# Altium integrated library chipfc_altium_libs.IntLib: 266 symbols (part 2 of 3)
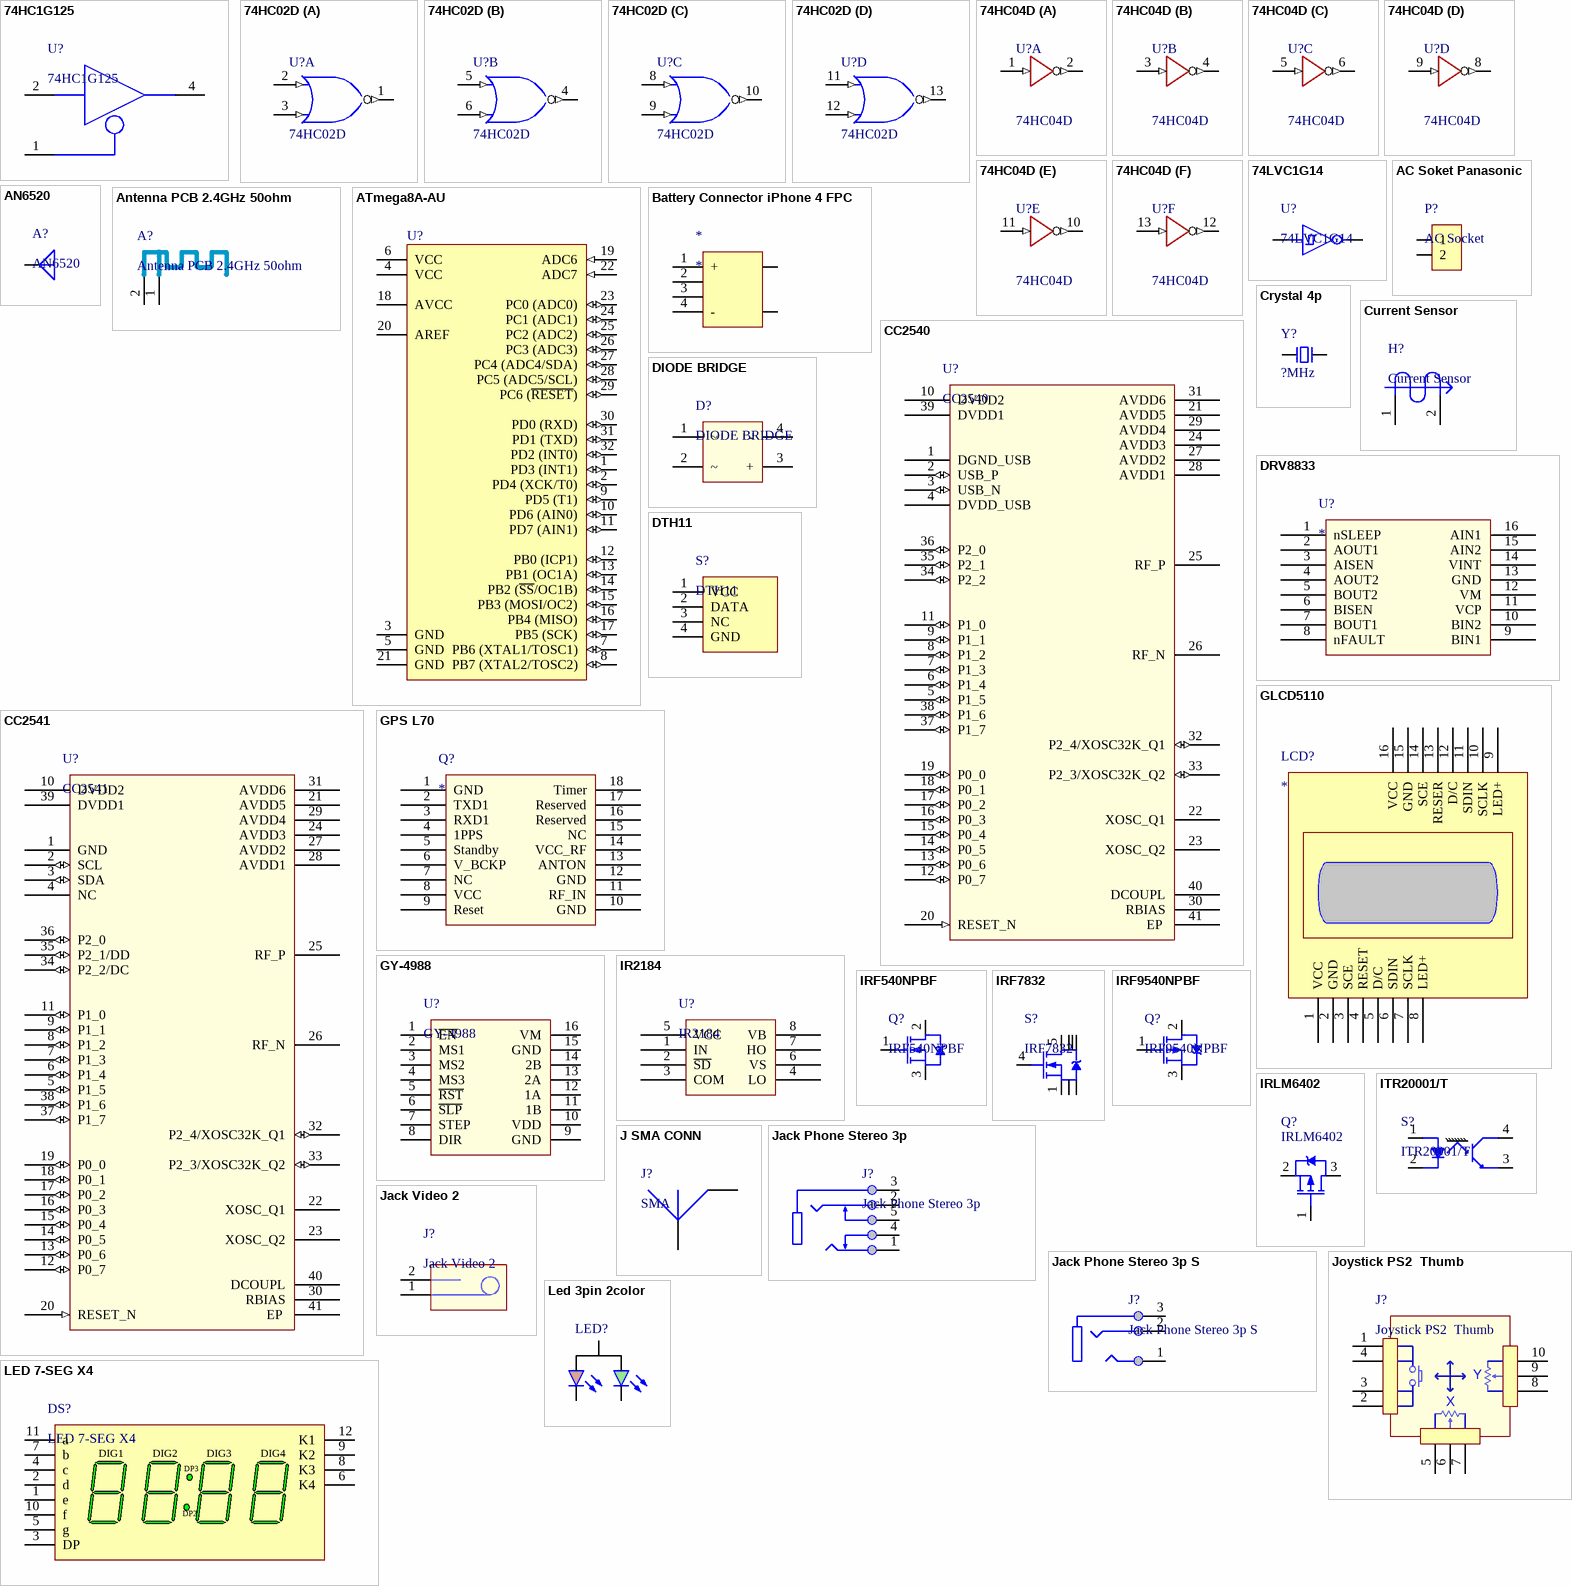
[diagram p16: symbols 74HC1G125 to LED 7-SEG X4]

## CC2540
designator U?
IC SOC BLUETOOTH SMART 40VQFN; PART NO: CC2540F128RHAR; BRAND: TI; PACKAGE: 40-VFQFN; TYPE: SMD
footprint QFN P50 40 CC254x (L)
footprint QFN P50 40 CC254x (N)
pins: 1 DGND_USB "Connect to GND", 2 USB_P (io) "USB P", 3 USB_N (io) "USB N", 4 DVDD_USB "2-V–3.6-V digital power-supply connection", 5 P1_5 (io) "Port 1.5", 6 P1_4 (io) "Port 1.4", 7 P1_3 (io) "Port 1.3", 8 P1_2 (io) "Port 1.2", 9 P1_1 (io) "Port 1.1 – 20-mA drive capability", 10 DVDD2 "2-V–3.6-V digital power-supply connection", 11 P1_0 (io) "Port 1.0 – 20-mA drive capability", 12 P0_7 (io) "Port 0.7", 13 P0_6 (io) "Port 0.6", 14 P0_5 (io) "Port 0.5", 15 P0_4 (io) "Port 0.4", 16 P0_3 (io) "Port 0.3", 17 P0_2 (io) "Port 0.2", 18 P0_1 (io) "Port 0.1", 19 P0_0 (io) "Port 0.0", 20 RESET_N (in) "Digital input", 21 AVDD5 "2-V–3.6-V analog power-supply connection", 22 XOSC_Q1 "32-MHz crystal oscillator pin 1 or external-clock input", 23 XOSC_Q2 "32-MHz crystal oscillator pin 2", 24 AVDD3 "2-V–3.6-V analog power-supply connection", 25 RF_P "Positive RF input signal to LNA during RX", 26 RF_N "Negative RF input signal to LNA during RX", 27 AVDD2 "2-V–3.6-V analog power-supply connection", 28 AVDD1 "2-V–3.6-V analog power-supply connection", 29 AVDD4 "2-V–3.6-V analog power-supply connection", 30 RBIAS "External precision bias resistor for reference current", 31 AVDD6 "2-V–3.6-V analog power-supply connection", 32 P2_4/XOSC32K_Q1 (io) "Port 2.4/32.768 kHz XOSC", 33 P2_3/XOSC32K_Q2 (io) "Port 2.3/32.768 kHz XOSC", 34 P2_2 (io) "Port 2.2", 35 P2_1 (io) "Port 2.1", 36 P2_0 (io) "Port 2.0", 37 P1_7 (io) "Port 1.7", 38 P1_6 (io) "Port 1.6", 39 DVDD1 "2-V–3.6-V digital power-supply connection", 40 DCOUPL "1.8-V digital power-supply decoupling. Do not use for supplying external circuits.", 41 EP  "Exposed Pad"

## CC2541
designator U?
IC SOC BLUETOOTH SMART 40VQFN; BRAND: TI; PACKAGE: 40-VFQFN; TYPE: SMD
footprint QFN P50 40 CC254x (L)
footprint QFN P50 40 CC254x (N)
pins: 1 GND "Connect to GND", 2 SCL (io) "Can be used as I2C clock pin or digital I/O", 3 SDA (io) "Can be used as I2C data pin or digital I/O", 4 NC "Not connected", 5 P1_5 (io) "Port 1.5", 6 P1_4 (io) "Port 1.4", 7 P1_3 (io) "Port 1.3", 8 P1_2 (io) "Port 1.2", 9 P1_1 (io) "Port 1.1 – 20-mA drive capability", 10 DVDD2 "2-V–3.6-V digital power-supply connection", 11 P1_0 (io) "Port 1.0 – 20-mA drive capability", 12 P0_7 (io) "Port 0.7", 13 P0_6 (io) "Port 0.6", 14 P0_5 (io) "Port 0.5", 15 P0_4 (io) "Port 0.4", 16 P0_3 (io) "Port 0.3", 17 P0_2 (io) "Port 0.2", 18 P0_1 (io) "Port 0.1", 19 P0_0 (io) "Port 0.0", 20 RESET_N (in) "Digital input", 21 AVDD5 "2-V–3.6-V analog power-supply connection", 22 XOSC_Q1 "32-MHz crystal oscillator pin 1 or external-clock input", 23 XOSC_Q2 "32-MHz crystal oscillator pin 2", 24 AVDD3 "2-V–3.6-V analog power-supply connection", 25 RF_P "Positive RF input signal to LNA during RX", 26 RF_N "Negative RF input signal to LNA during RX", 27 AVDD2 "2-V–3.6-V analog power-supply connection", 28 AVDD1 "2-V–3.6-V analog power-supply connection", 29 AVDD4 "2-V–3.6-V analog power-supply connection", 30 RBIAS "External precision bias resistor for reference current", 31 AVDD6 "2-V–3.6-V analog power-supply connection", 32 P2_4/XOSC32K_Q1 (io) "Port 2.4/32.768 kHz XOSC", 33 P2_3/XOSC32K_Q2 (io) "Port 2.3/32.768 kHz XOSC", 34 P2_2/DC (io) "Port 2.2 / debug clock", 35 P2_1/DD (io) "Port 2.1 / debug data", 36 P2_0 (io) "Port 2.0", 37 P1_7 (io) "Port 1.7", 38 P1_6 (io) "Port 1.6", 39 DVDD1 "2-V–3.6-V digital power-supply connection", 40 DCOUPL "1.8-V digital power-supply decoupling. Do not use for supplying external circuits.", 41 EP  "Exposed Pad"

## Crystal 4p
designator Y?, comment ?MHz
Crystal 4p
footprint Crystal SMD 4PIN 50x32
footprint Crystal SMD 4PIN 25x20
footprint Crystal SMD 4PIN 32x25
pins: 1 XTAL, 2 GND hidden to GND, 3 XTAL, 4 GND hidden to GND

## Current Sensor
designator H?
Current Sensor/Hall Sensor
footprint Current Sensor 18mm
pins: 1, 2

## DIODE BRIDGE
designator D?
footprint DiodeBridge-DB1S
footprint DiodeBridge-SOIC4; pin to pad 1>3 2>4 3>1 4>2
pins: 1 ~, 2 ~, 3 +, 4 -

## DRV8833
designator U?
footprint HTSSOP16 - DRV8833
pins: 1 nSLEEP, 2 AOUT1, 3 AISEN, 4 AOUT2, 5 BOUT2, 6 BISEN, 7 BOUT1, 8 nFAULT, 9 BIN1, 10 BIN2, 11 VCP, 12 VM, 13 GND, 14 VINT, 15 AIN2, 16 AIN1

## DTH11
designator S?
Temperature and humidity module
footprint DTH11 (Temperature and humidity module)
footprint DTH11/H (Temperature and humidity module)
pins: 1 VCC "power supply 3.5～5.5V DC", 2 DATA "serial data, a single bus", 3 NC "empty pin", 4 GND "ground, the negative power"

## GLCD5110
designator LCD?
footprint GLCD5110
pins: 1 VCC, 2 GND, 3 SCE, 4 RESET, 5 D/C, 6 SDIN, 7 SCLK, 8 LED+, 9 LED+, 10 SCLK, 11 SDIN, 12 D/C, 13 RESER, 14 SCE, 15 GND, 16 VCC

## GPS L70
designator Q?
QUECTEL L70 GPS
footprint GPS L70
pins: 1 GND, 2 TXD1, 3 RXD1, 4 1PPS, 5 Standby, 6 V_BCKP, 7 NC, 8 VCC, 9 Reset, 10 GND, 11 RF_IN, 12 GND, 13 ANTON, 14 VCC_RF, 15 NC, 16 Reserved, 17 Reserved, 18 Timer

## GY-4988
designator U?
footprint GY-4988 (Step motor driver)
pins: 1 ~{EN}, 2 MS1, 3 MS2, 4 MS3, 5 ~{RST}, 6 ~{SLP}, 7 STEP, 8 DIR, 9 GND, 10 VDD, 11 1B, 12 1A, 13 2A, 14 2B, 15 GND, 16 VM

## IR2184
designator U?
HALF-BRIDGE DRIVER
footprint SOIC-8 (SOIC, 8-Leads, Body 5.0x4.0mm (max), Pitch 1.27mm, IPC Medium Density)
pins: 1 IN, 2 ~{SD}, 3 COM, 4 LO, 5 VCC, 6 VS, 7 HO, 8 VB

## IRF540NPBF
designator Q?
MOSFET N-CH 100V 33A TO-220AB; BRAND: Infineon; TYPE: MI; PACKAGE: TO-220AB; PART NO: IRF540NPBF; STOCK CODE: IRF540NPBF-ND; SUPPLIER: Digi-Key
footprint TO-220AB
footprint TO-220AB L
footprint TO-220/HeatSink
pins: 1 G, 2 D, 3 S

## IRF7832
designator S?
MOSFET N-CH 30V 20A 8-SOIC; PART NO: IRF7832TRPBF; BRAND: Infineon; PACKAGE: 8-SOIC; STOCK CODE: IRF7832PBFCT-ND; SUPPLIER: Digi-Key; TYPE: SMD
footprint SOIC-8 (SOIC, 8-Leads, Body 5.0x4.0mm (max), Pitch 1.27mm, IPC Medium Density)
pins: 1 S, 2 S, 3 S, 4 G, 5 D, 6 D, 7 D, 8 D

## IRF9540NPBF
designator Q?
MOSFET P-CH 100V 23A TO-220AB; BRAND: Infineon; TYPE: MI; PACKAGE: TO-220AB; PART NO: IRF9540NPBF; STOCK CODE: IRF9540NPBF-ND; SUPPLIER: Digi-Key
footprint TO-220AB
footprint TO-220AB L
footprint TO-220/HeatSink
pins: 1 G, 2 D, 3 S

## IRLM6402
designator Q?
MOSFET P-Channel
footprint SOT-23 (SOT23, 3-Leads, Body 3.0x2.5mm (max), Pitch 0.95mm, IPC Medium Density)
pins: 1 G, 2 S, 3 D

## ITR20001/T
designator S?
OPTO INTERRUPTER
footprint ITR20001
pins: 1 A, 2 K, 3 E, 4 C

## J SMA CONN
designator J?, comment SMA
CONN SMA JACK R/A 50 OHM PCB
footprint J SMA CONN (Connector; RF Coaxial, MCX, Thru-Hole; 5 Position; Right Angle)
footprint J SMA CONN R/A (Connector; RF Coaxial, MCX, Thru-Hole; 5 Position; Right Angle)
pins: 1 SIG, 2 PAD

## Jack Phone Stereo 3p
designator J?
Connector Stereo Phone 3 poles
footprint J Phone 3 (Jack Phone 3-pole 5-pin)
pins: 1 L, 2 R, 3 COM, 4 LS, 5 RS

## Jack Phone Stereo 3p S
designator J?
Connector Stereo Phone 3 poles simple
footprint J Phone PJ-313 (Jack Phone 3-pole 5-pin)
footprint J Phone PJ-313D (Jack Phone 3-pole 5-pin)
pins: 1 L, 2 R, 3 COM

## Jack Video 2
designator J?
footprint J Video Jack (CFC UBEC 5V/3A Switching Module)
pins: 1 ~{OE}, 2 A

## Joystick PS2  Thumb
designator J?
footprint Joystick PS2 Thumb
pins: 1 K1, 2 K2, 3 K3, 4 K4, 5 X1, 6 X2, 7 X3, 8 Y1, 9 Y2, 10 Y3
text: Y; X

## Led 3pin 2color
designator LED?
Typical LED 3-pin 2-color
footprint LED 3PIN 2COLOR 5MM
pins: 1 RK, 2 A, 3 YK

## LED 7-SEG X4
designator DS?
LED 7-seg x4 HDSP-B09G
footprint LED 7-SEG X4 B-88 (LED, 7-Segment Display, 14.22 mm, Four Digit, 88:88; 12 Leads; Row Space 15.24 mm; Pitch 2.54 mm)
pins: 1 e "Digits (1-4) e Anode", 2 d "Digits (1-4) d Anode", 3 DP "Digits (2,3) DP Anode", 4 c "Digits (1-4) c Anode", 5 g "Digits (1-4) g Anode", 6 K4 "Digit 4 Common Cathode", 7 b "Digits (1-4) b Anode", 8 K3 "Digit 3 Common Cathode", 9 K2 "Digit 2 Common Cathode", 10 f "Digits (1-4) f Anode", 11 a "Digits (1-4) a Anode", 12 K1 "Digit 1 Common Cathode"
text: DIG1; DIG2; DIG3; DIG4; DP3; DP2

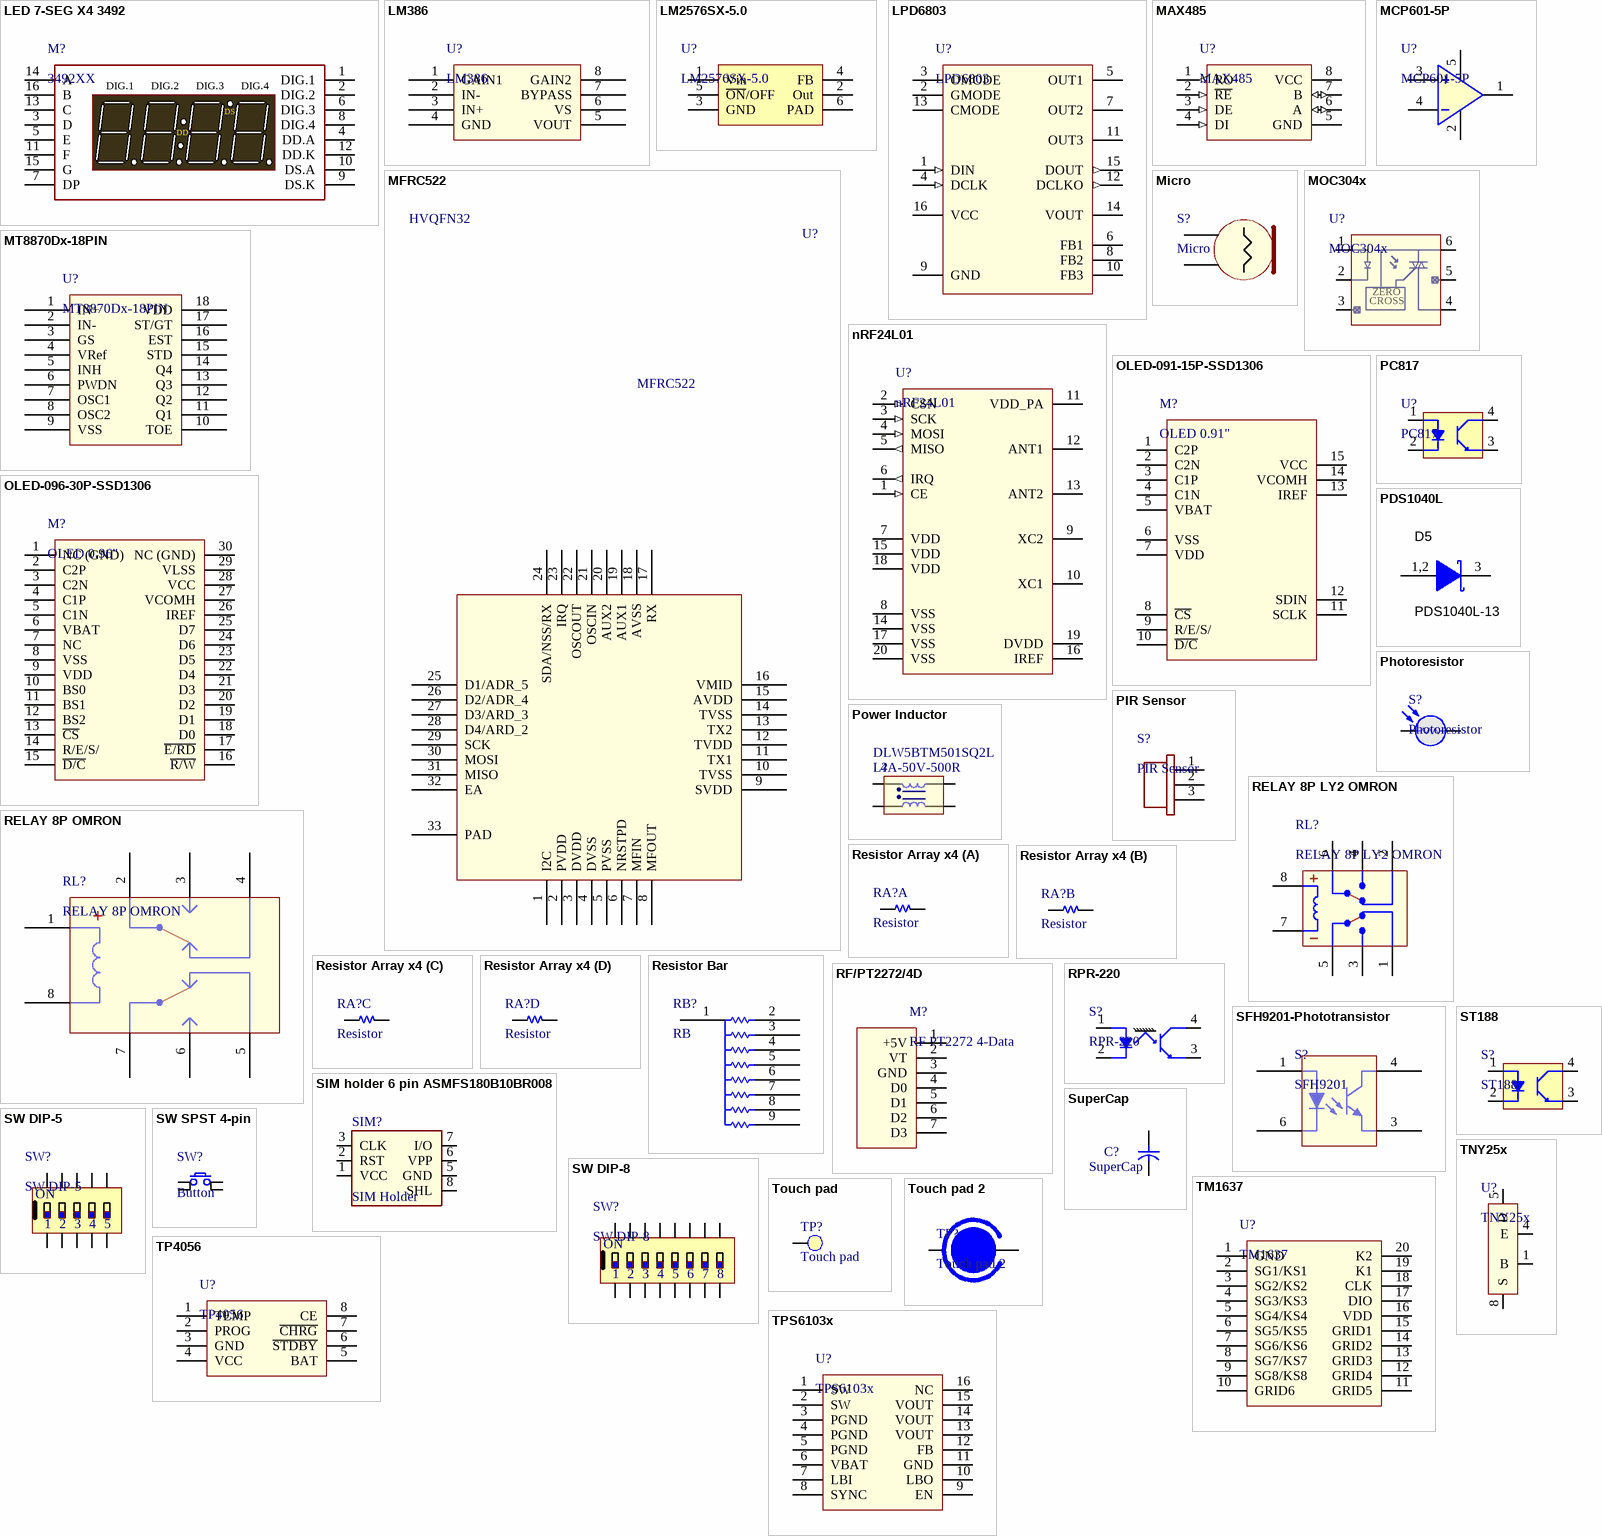
[diagram p6: symbols LED 7-SEG X4 3492 to TPS6103x]

## LED 7-SEG X4 3492
designator M?, comment 3492XX
LED 7-seg x4 HDSP-B09G
footprint LED 7-SEG X4 3492XX (LED, 7-Segment Display, 14.22 mm, Four Digit, 88:88; 12 Leads; Row Space 15.24 mm; Pitch 2.54 mm)
pins: 1 DIG.1, 2 DIG.2, 3 D, 4 DD.A, 5 E, 6 DIG.3, 7 DP, 8 DIG.4, 9 DS.K, 10 DS.A, 11 F, 12 DD.K, 13 C, 14 A, 15 G, 16 B
text: DS; DD

## LM386
designator U?
Low Voltage Audio Power Amplifier
footprint SOIC-8 (SOIC, 8-Leads, Body 5.0x4.0mm (max), Pitch 1.27mm, IPC Medium Density)
pins: 1 GAIN1, 2 IN-, 3 IN+, 4 GND, 5 VOUT, 6 VS, 7 BYPASS, 8 GAIN2

## LM2576SX-5.0
designator U?
IC REG BUCK 5V 3A TO263-5; PART NO: LM2576SX-5.0/NOPB; BRAND: TI; PACKAGE: TO-263-6; STOCK CODE: LM2576SX-5.0/NOPBCT-ND; SUPPLIER: Digi-Key; TYPE: SMD
footprint TO-263-6 (D2-PAK, 6-Pads, Body 8.9x10.4mm (max), IPC Medium Density)
pins: 1 Vin, 2 Out, 3 GND, 4 FB, 5 ~{ON}/OFF, 6 PAD

## LPD6803
designator U?
3-channel LED constant-current driver
footprint SOIC-16 (SOIC, 16-Leads, Body 10.0x4.0mm (max), Pitch 1.27mm, IPC Medium Density)
pins: 1 DIN (in) "Serial data input", 2 GMODE "Grey-level regulate mode", 3 OMODE "Control output polarity", 4 DCLK (in) "Serial data clock input", 5 OUT1 "Driver output", 6 FB1 "Feedback", 7 OUT2 "Driver output", 8 FB2 "Feedback", 9 GND (power) "Ground", 10 FB3 "Feedback", 11 OUT3 "Driver output", 12 DCLKO (out) "Serial clock output", 13 CMODE "Choose inside grey clock", 14 VOUT, 15 DOUT (out) "Serial data output", 16 VCC (power) "LDO power 4.5-8.0V"

## MAX485
designator U?
Low-Power, Slew-Rate-Limited  RS-485/RS-422 Transceivers
footprint SOIC-8 (SOIC, 8-Leads, Body 5.0x4.0mm (max), Pitch 1.27mm, IPC Medium Density)
pins: 1 RO (out) "Logic Data Output from RS-485 Receiver", 2 ~{RE} (in) "Receive Enable (active low)", 3 DE (in) "Driver Enable (active high)", 4 DI (in) "Logic Data Input to RS-485 Driver", 5 GND "Device Ground Pin", 6 A (io) "RS-422 or RS-485 Data Line", 7 B (io) "RS-422 or RS-485 Data Line", 8 VCC "Power Input. Connect to 5-V Power Source."

## MCP601-5P
designator U?
MCP601 SOT23-5
footprint SOT-23-5 (SOT23, 5-Leads, Body 3.0x3.0mm (max), Pitch 0.95mm, IPC Medium Density)
pins: 1 OUT, 2 V-, 3 +IN, 4 -IN, 5 V+

## MFRC522
designator U?  PACKAGE: HVQFN32
IC READER 13.56MHZ 32-HVQFN; PART NO: MFRC52201HN1; BRAND: NXP; TYPE: SMD
footprint HVQFN32
footprint HVQFN32-L
pins: 1 I2C, 2 PVDD, 3 DVDD, 4 DVSS, 5 PVSS, 6 NRSTPD, 7 MFIN, 8 MFOUT, 9 SVDD, 10 TVSS, 11 TX1, 12 TVDD, 13 TX2, 14 TVSS, 15 AVDD, 16 VMID, 17 RX, 18 AVSS, 19 AUX1, 20 AUX2, 21 OSCIN, 22 OSCOUT, 23 IRQ, 24 SDA/NSS/RX, 25 D1/ADR_5, 26 D2/ADR_4, 27 D3/ARD_3, 28 D4/ARD_2, 29 SCK, 30 MOSI, 31 MISO, 32 EA, 33 PAD

## Micro
designator S?
Microphone - Sound Sensor
footprint Micro 6mm Small
footprint Micro 10mm
pins: 1, 2

## MOC304x
designator U?
6-Pin DIP Random-Phase Optoisolators Triac Driver Output (250/400 Volt Peak)
footprint DIP 6 (DIP IC (2.54mm), 6 pins)
pins: 1 A, 2 K, 3 NC, 4 T2, 5 NC, 6 T1
text: ZERO; CROSS

## MT8870Dx-18PIN
designator U?
footprint SOP 18 50p
pins: 1 IN+, 2 IN-, 3 GS, 4 VRef, 5 INH, 6 PWDN, 7 OSC1, 8 OSC2, 9 VSS, 10 TOE, 11 Q1, 12 Q2, 13 Q3, 14 Q4, 15 STD, 16 EST, 17 ST/GT, 18 VDD

## nRF24L01
designator U?
IC RF TRANSCEIVER 2.4GHZ 20QFN; PART NO: NRF24L01P-R7; BRAND: Nordic; PACKAGE: QFN-20; TYPE: SMD
footprint QFN P50 20 nRF24L01
pins: 1 CE (in) "Chip Enable Activates RX or TX mode", 2 CSN (in) "SPI Chip Select", 3 SCK (in) "SPI Clock", 4 MOSI (in) "SPI Slave Data Input", 5 MISO (out) "SPI Slave Data Output, with tri-state option", 6 IRQ (out) "Maskable interrupt pin. Active low", 7 VDD (power) "Power Supply (+1.9V - +3.6V DC)", 8 VSS (power) "Ground (0V)", 9 XC2 "Crystal Pin 2", 10 XC1 "Crystal Pin 1", 11 VDD_PA "Power Supply Output (+1.8V) for the internal nRF24L01+ Power Amplifier.", 12 ANT1 "Antenna interface 1", 13 ANT2 "Antenna interface 2", 14 VSS (power) "Ground (0V)", 15 VDD (power) "Power Supply (+1.9V - +3.6V DC)", 16 IREF "Reference current. Connect a 22kΩ resistor to ground", 17 VSS (power) "Ground (0V)", 18 VDD (power) "Power Supply (+1.9V - +3.6V DC)", 19 DVDD "Internal digital supply output for de-coupling purposes.", 20 VSS (power) "Ground (0V)"

## OLED-091-15P-SSD1306
designator M?, comment OLED 0.91"
LCD OLED 0.91 inch 15 pins SSD1306
footprint OLED-091-15P-SSD1306
footprint OLED-091-15P-SSD1306-2
pins: 1 C2P, 2 C2N, 3 C1P, 4 C1N, 5 VBAT, 6 VSS, 7 VDD, 8 ~{CS}, 9 R/E/S/, 10 ~{D/C}, 11 SCLK, 12 SDIN, 13 IREF, 14 VCOMH, 15 VCC

## OLED-096-30P-SSD1306
designator M?, comment OLED 0.96"
LCD OLED 0.96 inch 30 pins SSD1306
footprint OLED-096-30P-SSD1306
pins: 1 NC (GND), 2 C2P, 3 C2N, 4 C1P, 5 C1N, 6 VBAT, 7 NC, 8 VSS, 9 VDD, 10 BS0, 11 BS1, 12 BS2, 13 ~{CS}, 14 R/E/S/, 15 ~{D/C}, 16 ~{R/W}, 17 ~{E/RD}, 18 D0, 19 D1, 20 D2, 21 D3, 22 D4, 23 D5, 24 D6, 25 D7, 26 IREF, 27 VCOMH, 28 VCC, 29 VLSS, 30 NC (GND)

## PC817
designator U?
Opto PC817B
footprint DIP4 - PC817
footprint SOP4 - PC817
pins: 1 A, 2 K, 3 E, 4 C

## PDS1040L
designator D5, comment PDS1040L-13
Diode Schottky 40V 10A Surface Mount PowerDI™ 5; Manufacturer: Diodes Inc; Thermal Resistance: 1.5°C/W Jl; Current - Reverse Leakage @ Vr: 600µA @ 40V; Speed: Fast Recovery =< 500ns, > 200mA (Io); Value: 490mV @ 10A; Supplier Part Number: PDS1040LDITR-ND; Supplier: Digi-Key; PartNumber: PDS1040L-13; Category: Discrete Semiconductor Products; PackageReference: PowerDI™ 5; Junction Operating Temp: -65°C ~ 150°C; Reverse Recovery Time (trr): -; Vr_V: 40V; Io_A: 10A; MountType: Surface Mount; RoHS: RoHS Compliant; Supplier Device Package: PowerDI®5; Packaging: Tape & Reel (TR); Capacitance @ Vr, F: -; Type: Schottky
footprint Diode powerdi5 (Diodes Inc recommended land pattern, ap02001.pdf rev 60)
pins: 1 A, 2 A, 3 K
text: 1,2

## Photoresistor
designator S?
Light dependent resistors
footprint PHOTOCELL/5mm (Photoresistor)
footprint PHOTOCELL/12mm (Photoresistor)
pins: 1, 2

## PIR Sensor
designator S?
Pyroelectric Infrared Radial Sensor; TYPE: MI
footprint PIR Sensor
footprint PIR Sensor - Lens L9006
footprint PIR Sensor - Lens S9006
pins: 1 Drain, 2 Source, 3 Ground

## Power Inductor
designator L?, comment DLW5BTM501SQ2L  TYPE: 4A-50V-500R
500R 4A 50V
footprint DLW5BT
pins: 1, 2, 3, 4
text: .

## RELAY 8P LY2 OMRON
designator RL?
footprint RELAY 8P LY2 OMRON (Role OMRON - Vo nhua trong)
pins: 1 NC2, 2 NC1, 3 NO2, 4 NO1, 5 COM2, 6 COM1, 7 N, 8 P

## RELAY 8P OMRON
designator RL?
footprint RELAY 8P OMRON (Role OMRON - Vo nhua trong)
pins: 1 P, 2 COM1, 3 NO1, 4 NC1, 5 NC2, 6 NO2, 7 COM2, 8 N
text: +

## Resistor Array x4
designator RA?, comment Resistor
footprint RAx4 1206 (3216) (Resistor Array x4 1206 (4D03))
part A pins: 1, 8
part B pins: 2, 7
part C pins: 3, 6
part D pins: 4, 5

## Resistor Bar
designator RB?, comment RB
footprint Resistor Bar 9-Pin
pins: 1, 2, 3, 4, 5, 6, 7, 8, 9

## RF/PT2272/4D
designator M?, comment RF PT2272 4-Data
RF 315/433MHz PT2272 4 lines data
footprint RF/PT2272/4D
pins: 1 +5V, 2 VT, 3 GND, 4 D0, 5 D1, 6 D2, 7 D3

## RPR-220
designator S?
Reflective photosensor (photoreflector)
footprint RPR-220 4-pin
pins: 1 A, 2 K, 3 E, 4 C

## SFH9201-Phototransistor
designator S?, comment SFH9201
footprint SFH9201-Phototransistor
pins: 1 Anode, 2 NC1 hidden, 3 Emitter, 4 Collector, 5 NC2 hidden, 6 Cathode

## SIM holder 6 pin ASMFS180B10BR008
designator SIM?, comment SIM Holder
SIM Card holder, 6 pins, Part no ASMFS180B10BR008
footprint CON SIM Holder ASMFS180B10BR008 (SIM Holder,  6 pins)
pins: 1 VCC (power), 2 RST, 3 CLK, 5 GND (power), 6 VPP, 7 I/O, 8 SHL (power) "Shield"

## ST188
designator S?
Photointerrupter Reflective
pins: 1 A, 2 K, 3 E, 4 C

## SuperCap
designator C?
footprint C Super Case A
footprint C Super Case B
footprint C Super 414-VA5R
pins: 1, 2

## SW DIP-5
designator SW?
footprint SW/DIP5/300
pins: 1, 2, 3, 4, 5, 6, 7, 8, 9, 10
text: ON

## SW DIP-8
designator SW?
footprint SW/DIP8/300
pins: 1, 2, 3, 4, 5, 6, 7, 8, 9, 10, 11, 12, 13, 14, 15, 16
text: ON

## SW SPST 4-pin
designator SW?, comment Button
Tact switch 4-pin
footprint SW/4/12mm
footprint SW/4/06MM
footprint SW/4/06MM-2
footprint SW/4/12mm-2
pins: 1, 2, 3, 4

## TM1637
designator U?
LED drivers control
footprint SOP 20 50p
pins: 1 GND, 2 SG1/KS1, 3 SG2/KS2, 4 SG3/KS3, 5 SG4/KS4, 6 SG5/KS5, 7 SG6/KS6, 8 SG7/KS7, 9 SG8/KS8, 10 GRID6, 11 GRID5, 12 GRID4, 13 GRID3, 14 GRID2, 15 GRID1, 16 VDD, 17 DIO, 18 CLK, 19 K1, 20 K2

## TNY25x
designator U?
TinySwitch Family - Energy Efficient, Low Power Off-line Switchers
footprint DIP 8 (DIP IC (2.54mm), 8 pins)
footprint SMD-8
pins: 1 B "BYPASS", 2 S "SOURCE", 3 S "SOURCE", 4 E "ENABLE", 5 D "DRAIN", 6 S "SOURCE", 7 S "SOURCE", 8 S "SOURCE"

## Touch pad
designator TP?
footprint Touch pad 15mm
pins: 1 TP

## Touch pad 2
designator TP?
Touch pad
footprint Touch pad 2 15mm
pins: 1 TP, 2 Shield

## TP4056
designator U?
1A Standalone Linear Li-lon Battery Charger with Thermal   Regulation in SOP-8
footprint SOIC-8 (SOIC, 8-Leads, Body 5.0x4.0mm (max), Pitch 1.27mm, IPC Medium Density)
pins: 1 TEMP, 2 PROG, 3 GND, 4 VCC, 5 BAT, 6 ~{STDBY}, 7 ~{CHRG}, 8 CE

## TPS6103x
designator U?
TPS61030/1/2 , BOOST CONVERTER WITH 4A SWITCH
footprint HTSSOP16 - TPS6103x
pins: 1 SW, 2 SW, 3 PGND, 4 PGND, 5 PGND, 6 VBAT, 7 LBI, 8 SYNC, 9 EN, 10 LBO, 11 GND, 12 FB, 13 VOUT, 14 VOUT, 15 VOUT, 16 NC

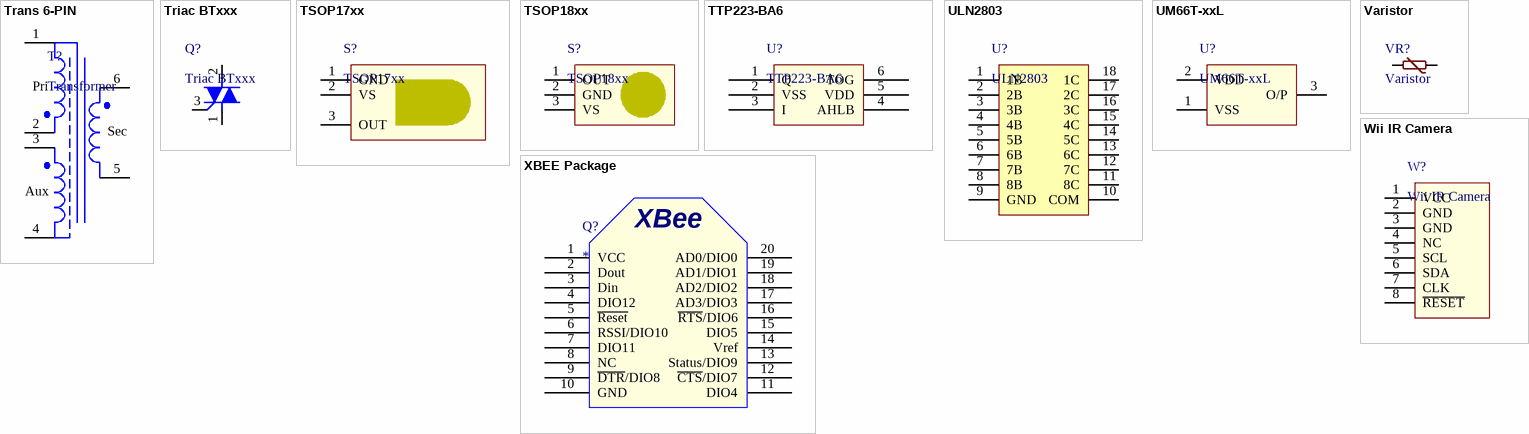
[diagram p7: symbols Trans 6-PIN to XBEE Package]

## Trans 6-PIN
designator T?, comment Transformer
Transformer 6-PIN
footprint Trans. EE16/6P (Tranformer EE16 6PIN)
footprint Trans. EE13/6P (Tranformer EE13 6PIN)
footprint Trans. EE13/EE16/6P (Tranformer EE16 6PIN)
pins: 1 A1, 2 A2, 3 B1, 4 B2, 5 C2, 6 C1
text: Pri; Sec; Aux

## Triac BTxxx
designator Q?
footprint TO-220AB
footprint TO-220AB L
pins: 1 T1, 2 T2, 3 G

## TSOP17xx
designator S?
infrared receivers
footprint TSOP17xx (TSOP17xx IR receiver)
pins: 1 GND, 2 VS, 3 OUT

## TSOP18xx
designator S?
infrared receivers
footprint TSOP18xx (TSOP18xx IR receiver)
pins: 1 OUT, 2 GND, 3 VS

## TTP223-BA6
designator U?
1 KEY TOUCH PAD DETECTOR
footprint SOP6
pins: 1 Q, 2 VSS, 3 I, 4 AHLB, 5 VDD, 6 TOG

## ULN2803
designator U?
TRANS 8NPN DARL 50V 0.5A 18SO; PART NO: ULN2803ADWR; BRAND: TI; PACKAGE: 18-SOIC; STOCK CODE: 296-15777-1-ND; SUPPLIER: Digi-Key; TYPE: SMD
footprint SOP 18 50p
pins: 1 1B, 2 2B, 3 3B, 4 4B, 5 5B, 6 6B, 7 7B, 8 8B, 9 GND, 10 COM, 11 8C, 12 7C, 13 6C, 14 5C, 15 4C, 16 3C, 17 2C, 18 1C

## UM66T-xxL
designator U?
UM66T-xxL Simple Melody Generator
footprint TO-92/W075
footprint TO-92/W100
footprint TO-92/W100A
footprint TO-92/W050
footprint TO-92/W065
pins: 1 VSS, 2 VDD, 3 O/P

## Varistor
designator VR?
footprint VARISTOR DISC 5MM/7MM (VARISTOR 23V 250A DISC 7MM)
pins: 1, 2

## Wii IR Camera
designator W?
footprint Wii IR Camera
pins: 1 VCC, 2 GND, 3 GND, 4 NC, 5 SCL, 6 SDA, 7 CLK, 8 ~{RESET}

## XBEE Package
designator Q?
XBEE Package
footprint XBEE Package
pins: 1 VCC, 2 Dout, 3 Din, 4 DIO12, 5 ~{Reset}, 6 RSSI/DIO10, 7 DIO11, 8 NC, 9 ~{DTR}/DIO8, 10 GND, 11 DIO4, 12 ~{CTS}/DIO7, 13 Status/DIO9, 14 Vref, 15 DIO5, 16 ~{RTS}/DIO6, 17 AD3/DIO3, 18 AD2/DIO2, 19 AD1/DIO1, 20 AD0/DIO0
text: XBee


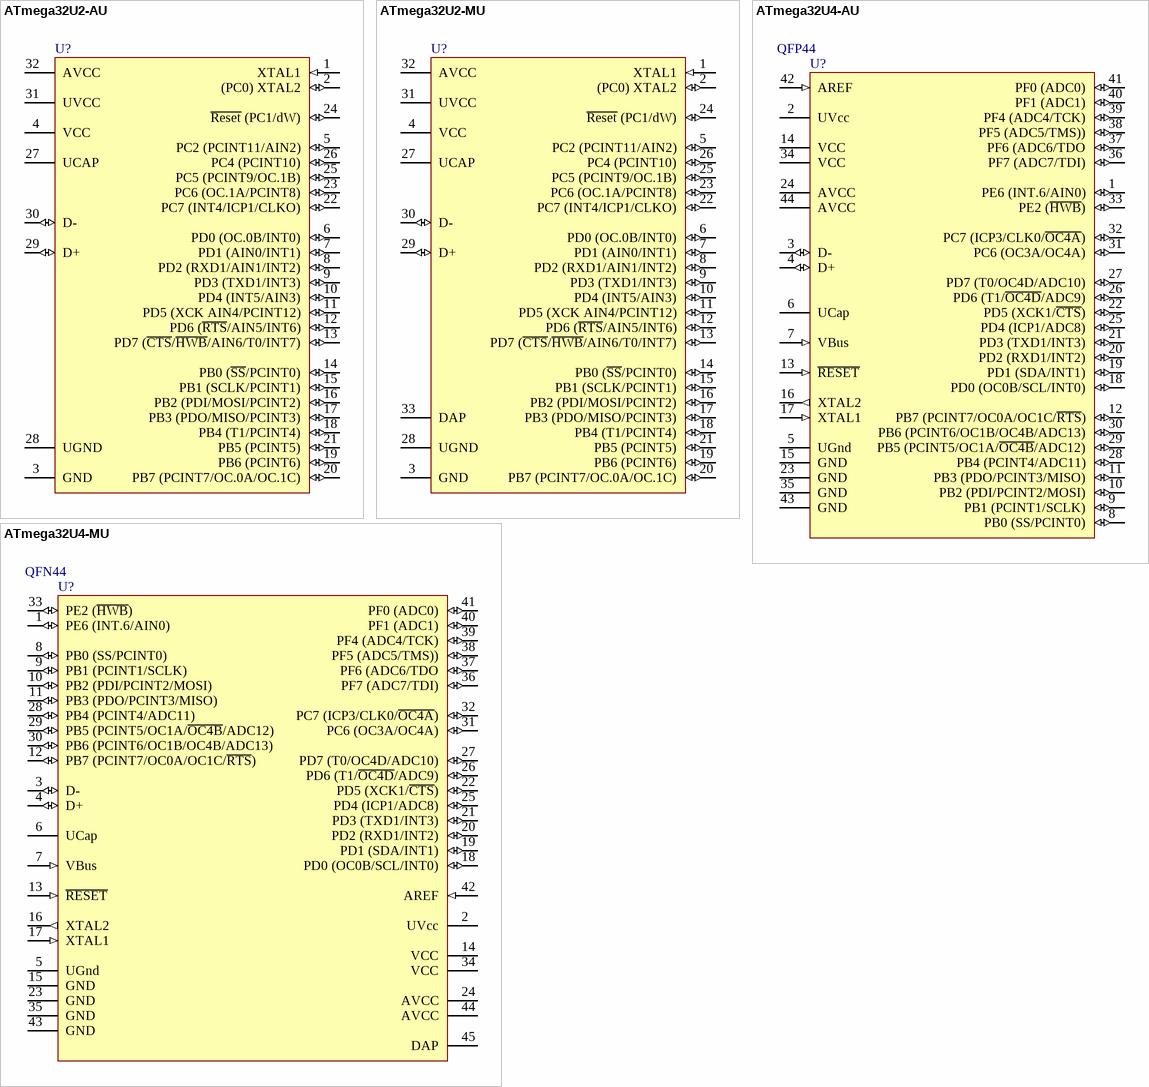
[diagram p8: symbols ATmega32U2-AU to ATmega32U4-MU]

## ATmega32U2-AU
designator U?
8-bit AVR Microcontroller, 2.7-5.5V, 32KB Flash, 1KB EEPROM, 1KB SRAM, 32-pin TQFP, Industrial Grade (-40°C to 85°C); Published: 1-Apr-2010; DatasheetVersion: revC, Dec-2009; PackageVersion: revB, Oct-2001; PackageReference: 32A; Publisher: Altium Limited; PackageDescription: 32-Lead, 7x7x1.0 mm Body, 0.8mm Lead Pitch, Thin Profile Plastic Quad Flat Package (TQFP); Supplier 1: Digi-Key; Supplier Part Number 1: ATMEGA32U2-AU-ND; Supplier 2: Farnell; Supplier Part Number 2: 1748524; Supplier 3: Mouser; Supplier Part Number 3: 556-ATMEGA32U2-AU; Code_JEDEC: MS-026-ABA; ComponentLink1Description: Manufacturer Link; ComponentLink1URL: http://www.atmel.com/products/avr/default.asp?; ComponentLink2Description: ATmega8U2/16U2/32U2 Datasheet; ComponentLink2URL: http://www.atmel.com/dyn/resources/prod_documents/doc7799.pdf; ComponentLink3Description: ATmega8U2/16U2/32U2 Summary; ComponentLink3URL: http://www.atmel.com/dyn/resources/prod_documents/7799S.pdf; ComponentLink4Description: Atmel.com Home; ComponentLink4URL: http://www.atmel.com
footprint 32A_N (Thin QFP, 32-Leads, Body 7x7mm, Pitch 0.8mm, IPC Medium Density)
footprint 32A_L (Thin QFP, 32-Leads, Body 7x7mm, Pitch 0.8mm, IPC High Density)
footprint 32A_M (Thin QFP, 32-Leads, Body 7x7mm, Pitch 0.8mm, IPC Low Density)
pins: 1 XTAL1 (in), 2 (PC0) XTAL2 (io), 3 GND (power), 4 VCC (power), 5 PC2 (PCINT11/AIN2) (io), 6 PD0 (OC.0B/INT0) (io), 7 PD1 (AIN0/INT1) (io), 8 PD2 (RXD1/AIN1/INT2) (io), 9 PD3 (TXD1/INT3) (io), 10 PD4 (INT5/AIN3) (io), 11 PD5 (XCK AIN4/PCINT12) (io), 12 PD6 (~{RTS}/AIN5/INT6) (io), 13 PD7 (~{CTS}/~{HWB}/AIN6/T0/INT7) (io), 14 PB0 (~{SS}/PCINT0) (io), 15 PB1 (SCLK/PCINT1) (io), 16 PB2 (PDI/MOSI/PCINT2) (io), 17 PB3 (PDO/MISO/PCINT3) (io), 18 PB4 (T1/PCINT4) (io), 19 PB6 (PCINT6) (io), 20 PB7 (PCINT7/OC.0A/OC.1C) (io), 21 PB5 (PCINT5) (io), 22 PC7 (INT4/ICP1/CLKO) (io), 23 PC6 (OC.1A/PCINT8) (io), 24 ~{Reset} (PC1/dW) (io), 25 PC5 (PCINT9/OC.1B) (io), 26 PC4 (PCINT10) (io), 27 UCAP (power), 28 UGND (power), 29 D+ (io), 30 D- (io), 31 UVCC (power), 32 AVCC (power)

## ATmega32U2-MU
designator U?
8-bit AVR Microcontroller, 2.7-5.5V, 32KB Flash, 1KB EEPROM, 1KB SRAM, 32-pin VQFN, Industrial Grade (-40°C to 85°C); Published: 1-Apr-2010; DatasheetVersion: revC, Dec-2009; PackageVersion: revA, Oct-2008; PackageReference: 32PG; Publisher: Altium Limited; PackageDescription: 32-Pin Quad Flat No-Lead (QFN) Sawn,  5 x 5 x 1.0 mm Body, Pitch 0.50 mm, 3.60mm Exposed Pad; Supplier 1: Digi-Key; Supplier Part Number 1: ATMEGA32U2-MU-ND; Supplier 2: Mouser; Supplier Part Number 2: 556-ATMEGA32U2-MU; Code_JEDEC: MO-220WHHD-2; ComponentLink1Description: Manufacturer Link; ComponentLink1URL: http://www.atmel.com/products/avr/default.asp?; ComponentLink2Description: ATmega8U2/16U2/32U2 Datasheet; ComponentLink2URL: http://www.atmel.com/dyn/resources/prod_documents/doc7799.pdf; ComponentLink3Description: ATmega8U2/16U2/32U2 Summary; ComponentLink3URL: http://www.atmel.com/dyn/resources/prod_documents/7799S.pdf; ComponentLink4Description: Atmel.com Home; ComponentLink4URL: http://www.atmel.com
footprint 32PG_N (QFN, 32-Leads, Body 5x5mm, Pitch 0.5mm, IPC Medium Density)
footprint 32PG_L (QFN, 32-Leads, Body 5x5mm, Pitch 0.5mm, IPC High Density)
footprint 32PG_M (QFN, 32-Leads, Body 5x5mm, Pitch 0.5mm, IPC Low Density)
pins: 1 XTAL1 (in), 2 (PC0) XTAL2 (io), 3 GND (power), 4 VCC (power), 5 PC2 (PCINT11/AIN2) (io), 6 PD0 (OC.0B/INT0) (io), 7 PD1 (AIN0/INT1) (io), 8 PD2 (RXD1/AIN1/INT2) (io), 9 PD3 (TXD1/INT3) (io), 10 PD4 (INT5/AIN3) (io), 11 PD5 (XCK AIN4/PCINT12) (io), 12 PD6 (~{RTS}/AIN5/INT6) (io), 13 PD7 (~{CTS}/~{HWB}/AIN6/T0/INT7) (io), 14 PB0 (~{SS}/PCINT0) (io), 15 PB1 (SCLK/PCINT1) (io), 16 PB2 (PDI/MOSI/PCINT2) (io), 17 PB3 (PDO/MISO/PCINT3) (io), 18 PB4 (T1/PCINT4) (io), 19 PB6 (PCINT6) (io), 20 PB7 (PCINT7/OC.0A/OC.1C) (io), 21 PB5 (PCINT5) (io), 22 PC7 (INT4/ICP1/CLKO) (io), 23 PC6 (OC.1A/PCINT8) (io), 24 ~{Reset} (PC1/dW) (io), 25 PC5 (PCINT9/OC.1B) (io), 26 PC4 (PCINT10) (io), 27 UCAP (power), 28 UGND (power), 29 D+ (io), 30 D- (io), 31 UVCC (power), 32 AVCC (power), 33 DAP (power)

## ATmega32U4-AU
designator U?  PACKAGE: QFP44
8-bit AVR Microcontroller, 2.7-5.5V, 32KB Flash, 2.5KB EEPROM, 1KB SRAM, USB Controller, 44-pin TQFP, Industrial Grade (-40°C to 85°C); BRAND: Atmel
footprint 44ML_L (Thin QFP, 44-Leads, Body 10x10mm, Pitch 0.8mm, IPC High Density)
footprint 44ML_M (Thin QFP, 44-Leads, Body 10x10mm, Pitch 0.8mm, IPC Low Density)
footprint 44ML_N (Thin QFP, 44-Leads, Body 10x10mm, Pitch 0.8mm, IPC Medium Density)
pins: 1 PE6 (INT.6/AIN0) (io), 2 UVcc (power), 3 D- (io), 4 D+ (io), 5 UGnd (power), 6 UCap, 7 VBus (in), 8 PB0 (SS/PCINT0) (io), 9 PB1 (PCINT1/SCLK) (io), 10 PB2 (PDI/PCINT2/MOSI) (io), 11 PB3 (PDO/PCINT3/MISO) (io), 12 PB7 (PCINT7/OC0A/OC1C/~{RTS}) (io), 13 ~{RESET} (in), 14 VCC (power), 15 GND (power), 16 XTAL2 (out), 17 XTAL1 (in), 18 PD0 (OC0B/SCL/INT0) (io), 19 PD1 (SDA/INT1) (io), 20 PD2 (RXD1/INT2) (io), 21 PD3 (TXD1/INT3) (io), 22 PD5 (XCK1/~{CTS}) (io), 23 GND (power), 24 AVCC (power), 25 PD4 (ICP1/ADC8) (io), 26 PD6 (T1/~{OC4D}/ADC9) (io), 27 PD7 (T0/OC4D/ADC10) (io), 28 PB4 (PCINT4/ADC11) (io), 29 PB5 (PCINT5/OC1A/~{OC4B}/ADC12) (io), 30 PB6 (PCINT6/OC1B/OC4B/ADC13) (io), 31 PC6 (OC3A/OC4A) (io), 32 PC7 (ICP3/CLK0/~{OC4A}) (io), 33 PE2 (~{HWB}) (io), 34 VCC (power), 35 GND (power), 36 PF7 (ADC7/TDI) (io), 37 PF6 (ADC6/TDO (io), 38 PF5 (ADC5/TMS)) (io), 39 PF4 (ADC4/TCK) (io), 40 PF1 (ADC1) (io), 41 PF0 (ADC0) (io), 42 AREF (in), 43 GND (power), 44 AVCC (power)

## ATmega32U4-MU
designator U?  PACKAGE: QFN44
8-bit AVR Microcontroller, 2.7-5.5V, 32KB Flash, 2.5KB EEPROM, 1KB SRAM, USB Controller, 44-pin QFN, Industrial Grade (-40°C to 85°C); BRAND: Atmel
footprint 44PW_L (QFN, 44-Leads, Body 7x7mm, Pitch 0.5mm, IPC High Density)
footprint 44PW_M (QFN, 44-Leads, Body 7x7mm, Pitch 0.5mm, IPC Low Density)
footprint 44PW_N (QFN, 44-Leads, Body 7x7mm, Pitch 0.5mm, IPC Medium Density)
pins: 1 PE6 (INT.6/AIN0) (io), 2 UVcc (power), 3 D- (io), 4 D+ (io), 5 UGnd (power), 6 UCap, 7 VBus (in), 8 PB0 (SS/PCINT0) (io), 9 PB1 (PCINT1/SCLK) (io), 10 PB2 (PDI/PCINT2/MOSI) (io), 11 PB3 (PDO/PCINT3/MISO) (io), 12 PB7 (PCINT7/OC0A/OC1C/~{RTS}) (io), 13 ~{RESET} (in), 14 VCC (power), 15 GND (power), 16 XTAL2 (out), 17 XTAL1 (in), 18 PD0 (OC0B/SCL/INT0) (io), 19 PD1 (SDA/INT1) (io), 20 PD2 (RXD1/INT2) (io), 21 PD3 (TXD1/INT3) (io), 22 PD5 (XCK1/~{CTS}) (io), 23 GND (power), 24 AVCC (power), 25 PD4 (ICP1/ADC8) (io), 26 PD6 (T1/~{OC4D}/ADC9) (io), 27 PD7 (T0/OC4D/ADC10) (io), 28 PB4 (PCINT4/ADC11) (io), 29 PB5 (PCINT5/OC1A/~{OC4B}/ADC12) (io), 30 PB6 (PCINT6/OC1B/OC4B/ADC13) (io), 31 PC6 (OC3A/OC4A) (io), 32 PC7 (ICP3/CLK0/~{OC4A}) (io), 33 PE2 (~{HWB}) (io), 34 VCC (power), 35 GND (power), 36 PF7 (ADC7/TDI) (io), 37 PF6 (ADC6/TDO (io), 38 PF5 (ADC5/TMS)) (io), 39 PF4 (ADC4/TCK) (io), 40 PF1 (ADC1) (io), 41 PF0 (ADC0) (io), 42 AREF (in), 43 GND (power), 44 AVCC (power), 45 DAP (power)

